# Altium schematic symbol library relay.SCHLIB: 425 symbols (part 3 of 3)
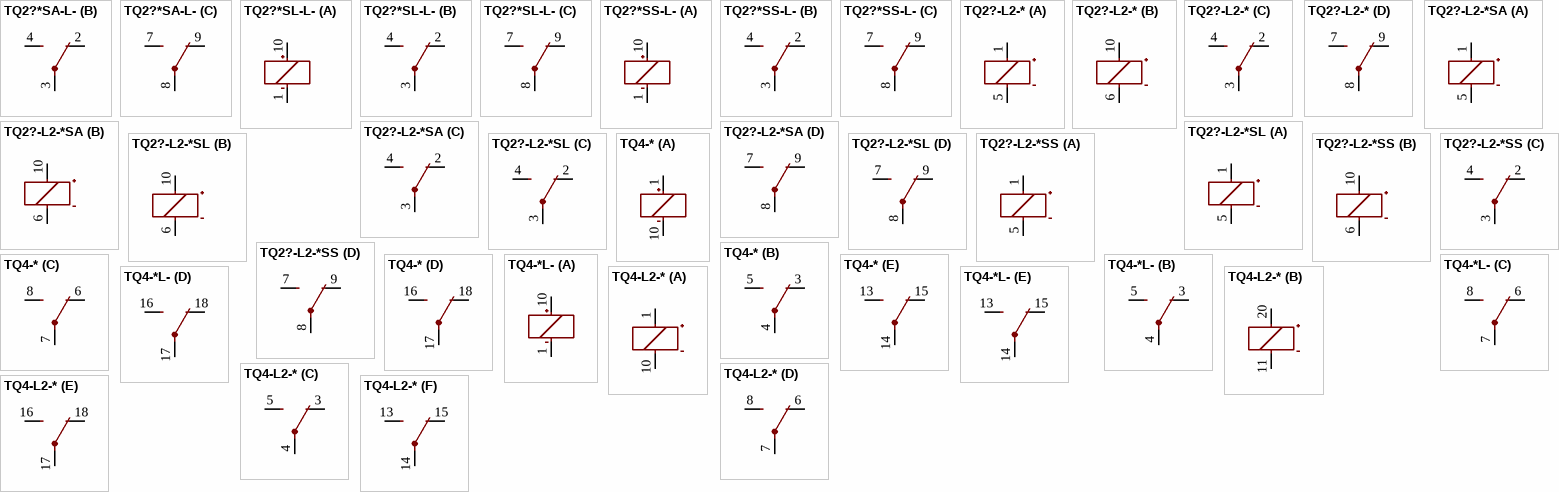
[diagram p32: symbols TQ2?*SA-L- to TQ4-L2-*]

## TQ2?-L2-*SS
designator K?, comment LOW PROFILE 2 FORM C RELAY NAiS   2 coil latching Source: http://www.mew-europe.com/..  en_ds_61020_0001.pdf Source: http://www.mew-europe.com/..  en_ds_61020_0002.pdf  (value not drawn)
MPN: TQ2SS-L2-12V; MPN: TQ2SS-L2-24V; MPN: TQ2SS-L2-3V; MPN: TQ2SS-L2-4.5V-Z; MPN: TQ2SS-L2-5V; MF: AROMAT/ MATSUSHITA; OC_FARNELL: unknown; OC_NEWARK: unknown; OC_NEWARK: 15P9800; OC_NEWARK: 15P9801; OC_NEWARK: 15P9802; OC_NEWARK: 15P9803; OC_NEWARK: 64K3206
footprint TQ-SS
part A pins: 1 +, 5 -
part B pins: 6 -, 10 +
part C pins: 2 O, 3 P, 4 S
part D pins: 7 S, 8 P, 9 O

## TQ4-*
designator K?, comment LOW PROFILE 2 FORM C RELAY NAiS   Source: http://www.mew-europe.com/..  en_ds_61020_0001.pdf  (value not drawn)
MPN: TQ4-24V; MPN: TQ4-3V; MPN: TQ4-4.5V; MPN: TQ4-5V; MF: AROMAT/ MATSUSHITA; OC_FARNELL: unknown; OC_NEWARK: unknown; OC_FARNELL: 1608334; OC_NEWARK: 64K3210; OC_NEWARK: 13P9240; OC_NEWARK: 13P9241; OC_FARNELL: 1448362; OC_NEWARK: 67K1293
footprint TQ4
part A pins: 1 +, 10 -
part B pins: 3 O, 4 P, 5 S
part C pins: 6 O, 7 P, 8 S
part D pins: 16 S, 17 P, 18 O
part E pins: 13 S, 14 P, 15 O

## TQ4-*L-
designator K?, comment LOW PROFILE 2 FORM C RELAY NAiS   Source: http://www.mew-europe.com/..  en_ds_61020_0001.pdf  (value not drawn)
OC_FARNELL: unknown; OC_NEWARK: unknown; OC_FARNELL: 1448362
footprint TQ4
part A pins: 1 -, 10 +
part B pins: 3 O, 4 P, 5 S
part C pins: 6 O, 7 P, 8 S
part D pins: 16 S, 17 P, 18 O
part E pins: 13 S, 14 P, 15 O

## TQ4-L2-*
designator K?, comment LOW PROFILE 2 FORM C RELAY NAiS   2 coil latching Source: http://www.mew-europe.com/..  en_ds_61020_0001.pdf  (value not drawn)
MPN: TQ4-L2-12V; MPN: TQ4-L2-24V; MPN: TQ4-L2-5V; MF: AROMAT/ MATSUSHITA; OC_FARNELL: unknown; OC_NEWARK: 90F5822; OC_NEWARK: 15P9807; OC_NEWARK: unknown; OC_NEWARK: 64K3208
footprint TQ4
part A pins: 1 +, 10 -
part B pins: 11 -, 20 +
part C pins: 3 O, 4 P, 5 S
part D pins: 6 O, 7 P, 8 S
part E pins: 16 S, 17 P, 18 O
part F pins: 13 S, 14 P, 15 O

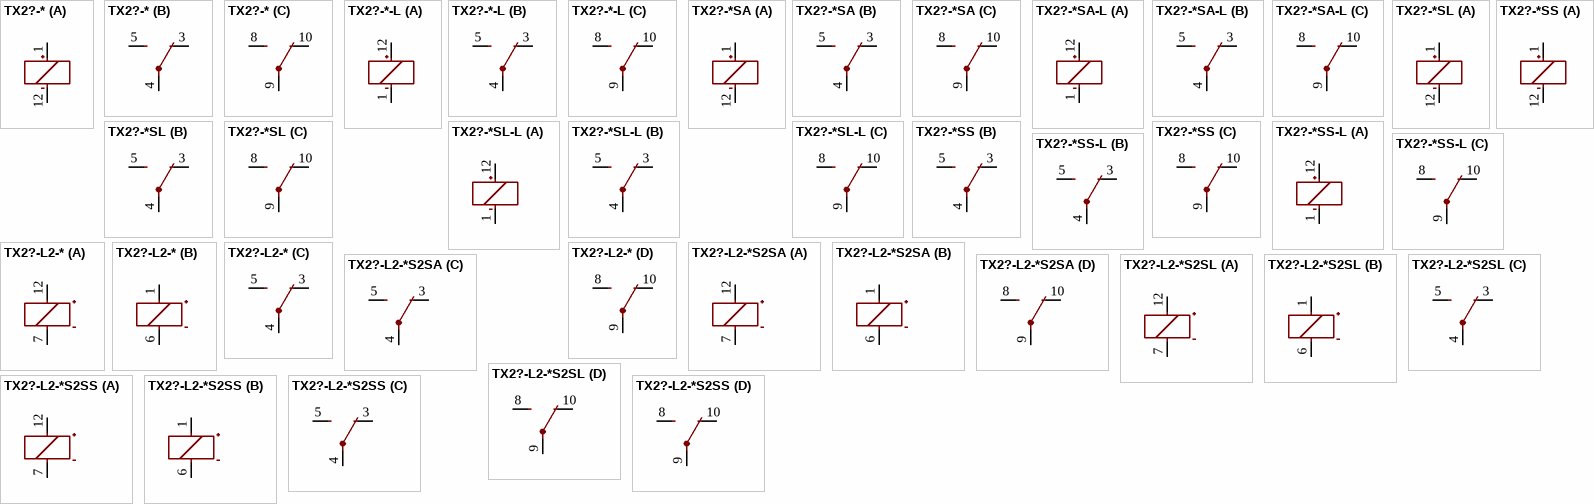
[diagram p26: symbols TX2?-* to TX2?-L2-*S2SS]

## TX2?-*
designator K?, comment 2 AMP. HIGH CAPACITY RELAY NAiS   WITH HIGH SURGE VOLTAGE & HIGH BREAKDOWN VOLTAGE Source: http://www.mew-europe.com/..  en_ds_61022_0001.pdf  (value not drawn)
MPN: TX2-1.5V; MPN: TX2-12V; MPN: TX2-24V; MPN: TX2-3V; MPN: TX2-4.5V; MPN: TX2-5V; MPN: TX2-6V; MPN: TX2-9V; MF: AROMAT/ MATSUSHITA; OC_FARNELL: unknown; OC_NEWARK: 13P9570; OC_FARNELL: 1200952; OC_NEWARK: 67K1295; OC_FARNELL: 1124059; OC_NEWARK: 64K3215; OC_NEWARK: 13P9573; OC_FARNELL: 1200950; OC_NEWARK: 64K3216; OC_NEWARK: 67K1296; OC_NEWARK: 11C0387; OC_NEWARK: 11C0388
footprint TX2
part A pins: 1 +, 12 -
part B pins: 3 O, 4 P, 5 S
part C pins: 8 S, 9 P, 10 O

## TX2?-*-L
designator K?, comment 2 AMP. HIGH CAPACITY RELAY NAiS   WITH HIGH SURGE VOLTAGE & HIGH BREAKDOWN VOLTAGE Source: http://www.mew-europe.com/..  en_ds_61022_0001.pdf  (value not drawn)
MPN: TX2-L-12V; MPN: TX2-L-24V-1; MPN: TX2-L-3V; MPN: TX2-L-4.5V; MPN: TX2-L-5V; MPN: TX2-L-9V; OC_FARNELL: unknown; OC_NEWARK: unknown; OC_NEWARK: 11C0367; OC_NEWARK: 12N3976; OC_NEWARK: 15P9975; OC_NEWARK: 15P9976; OC_NEWARK: 15P9977; OC_NEWARK: 15P9978
footprint TX2
part A pins: 1 -, 12 +
part B pins: 3 O, 4 P, 5 S
part C pins: 8 S, 9 P, 10 O

## TX2?-*SA
designator K?, comment 2 AMP. HIGH CAPACITY RELAY NAiS   WITH HIGH SURGE VOLTAGE & HIGH BREAKDOWN VOLTAGE Source: http://www.mew-europe.com/..  en_ds_61022_0001.pdf  (value not drawn)
MPN: TX2SA-12V; MPN: TX2SA-24V; MPN: TX2SA-3V; MPN: TX2SA-4.5V; MPN: TX2SA-5V; MPN: TX2SA-6V-X; MPN: TX2SA-9V; MF: AROMAT/ MATSUSHITA; OC_FARNELL: unknown; OC_NEWARK: unknown; OC_FARNELL: 910480; OC_NEWARK: 64K3217; OC_FARNELL: 1652603; OC_NEWARK: 64K3218; OC_NEWARK: 13P9584; OC_NEWARK: 92F1604; OC_FARNELL: 1200957; OC_NEWARK: 13P9589; OC_NEWARK: 13P9592; OC_NEWARK: 13P9593
footprint TX2SA
part A pins: 1 +, 12 -
part B pins: 3 O, 4 P, 5 S
part C pins: 8 S, 9 P, 10 O

## TX2?-*SA-L
designator K?, comment 2 AMP. HIGH CAPACITY RELAY NAiS   WITH HIGH SURGE VOLTAGE & HIGH BREAKDOWN VOLTAGE Source: http://www.mew-europe.com/..  en_ds_61022_0001.pdf  (value not drawn)
OC_FARNELL: unknown; OC_NEWARK: unknown
footprint TX2SA
part A pins: 1 -, 12 +
part B pins: 3 O, 4 P, 5 S
part C pins: 8 S, 9 P, 10 O

## TX2?-*SL
designator K?, comment 2 AMP. HIGH CAPACITY RELAY NAiS   WITH HIGH SURGE VOLTAGE & HIGH BREAKDOWN VOLTAGE Source: http://www.mew-europe.com/..  en_ds_61022_0001.pdf  (value not drawn)
MPN: TX2SL-12V; MPN: TX2SL-24V; MPN: TX2SL-3V; MPN: TX2SL-4.5V; MPN: TX2SL-48V; MPN: TX2SL-5V; MPN: TX2SL-9V-1; MF: AROMAT/ MATSUSHITA; OC_FARNELL: unknown; OC_NEWARK: unknown; OC_NEWARK: 11C0519; OC_NEWARK: 16P9442; OC_NEWARK: 13P9598; OC_NEWARK: 13P9600; OC_NEWARK: 13P9602; OC_NEWARK: 13P9603; OC_NEWARK: 11N6123
footprint TX2SL
part A pins: 1 +, 12 -
part B pins: 3 O, 4 P, 5 S
part C pins: 8 S, 9 P, 10 O

## TX2?-*SL-L
designator K?, comment 2 AMP. HIGH CAPACITY RELAY NAiS   WITH HIGH SURGE VOLTAGE & HIGH BREAKDOWN VOLTAGE Source: http://www.mew-europe.com/..  en_ds_61022_0001.pdf  (value not drawn)
MPN: TX2SL-L-24V-1; MPN: TX2SL-L-3V; MF: AROMAT/ MATSUSHITA; OC_FARNELL: unknown; OC_NEWARK: unknown; OC_NEWARK: 12N3990; OC_NEWARK: 11C0477
footprint TX2SL
part A pins: 1 -, 12 +
part B pins: 3 O, 4 P, 5 S
part C pins: 8 S, 9 P, 10 O

## TX2?-*SS
designator K?, comment 2 AMP. HIGH CAPACITY RELAY NAiS   WITH HIGH SURGE VOLTAGE & HIGH BREAKDOWN VOLTAGE Source: http://www.mew-europe.com/..  en_ds_61022_0001.pdf  (value not drawn)
MPN: TX2SS-24V; MPN: TX2SS-3V-Z; MPN: TX2SS-4.5V; MPN: TX2SS-48V; MPN: TX2SS-5V; OC_FARNELL: unknown; OC_NEWARK: unknown; OC_NEWARK: 13P9605; OC_NEWARK: 13P9606; OC_NEWARK: 13P9607; OC_NEWARK: 13P9609; OC_NEWARK: 13P9610
footprint TX2SS
part A pins: 1 +, 12 -
part B pins: 3 O, 4 P, 5 S
part C pins: 8 S, 9 P, 10 O

## TX2?-*SS-L
designator K?, comment 2 AMP. HIGH CAPACITY RELAY NAiS   WITH HIGH SURGE VOLTAGE & HIGH BREAKDOWN VOLTAGE Source: http://www.mew-europe.com/..  en_ds_61022_0001.pdf  (value not drawn)
MPN: TX2SS-L-12V-Z; MPN: TX2SS-L-3V-1; MF: AROMAT/ MATSUSHITA; OC_FARNELL: unknown; OC_NEWARK: unknown; OC_NEWARK: 11C0549; OC_NEWARK: 12N3991
footprint TX2SS
part A pins: 1 -, 12 +
part B pins: 3 O, 4 P, 5 S
part C pins: 8 S, 9 P, 10 O

## TX2?-L2-*
designator K?, comment TX Relay 2 coil latching NAiS   2 AMP. HIGH CAPACITY RELAY WITH HIGH SURGE VOLTAGE & HIGH BREAKDOWN VOLTAGE Source: http://www.mew-europe.com/..  en_ds_61022_0001.pdf TX-S SMALL POLARIZED WITH HIGH SENSITIVITY 50mW Source: http://www.mew-europe.com/..  en_ds_61022_0022.pdf  (value not drawn)
MPN: TX2-L2-12V; MPN: TX2-L2-24V; MPN: TX2-L2-3V-1; MPN: TX2-L2-4.5V; MPN: TX2-L2-5V; MPN: TX2-L2-9V; MF: AROMAT/ MATSUSHITA; OC_FARNELL: unknown; OC_NEWARK: unknown; OC_FARNELL: 1124060; OC_NEWARK: 64K3213; OC_FARNELL: 1124061; OC_NEWARK: 31M0467; OC_NEWARK: 12N3980; OC_NEWARK: 15P9981; OC_FARNELL: 625826; OC_NEWARK: 15P9982; OC_NEWARK: 15P9984
footprint TX2-L2
part A pins: 7 -, 12 +
part B pins: 1 +, 6 -
part C pins: 3 O, 4 P, 5 S
part D pins: 8 S, 9 P, 10 O

## TX2?-L2-*S2SA
designator K?, comment TX Relay 2 coil latching NAiS   2 AMP. HIGH CAPACITY RELAY WITH HIGH SURGE VOLTAGE & HIGH BREAKDOWN VOLTAGE Source: http://www.mew-europe.com/..  en_ds_61022_0001.pdf TX-S SMALL POLARIZED WITH HIGH SENSITIVITY 50mW Source: http://www.mew-europe.com/..  en_ds_61022_0022.pdf  (value not drawn)
OC_FARNELL: unknown; OC_NEWARK: unknown
footprint TX2SA-L2
part A pins: 7 -, 12 +
part B pins: 1 +, 6 -
part C pins: 3 O, 4 P, 5 S
part D pins: 8 S, 9 P, 10 O

## TX2?-L2-*S2SL
designator K?, comment TX Relay 2 coil latching NAiS   2 AMP. HIGH CAPACITY RELAY WITH HIGH SURGE VOLTAGE & HIGH BREAKDOWN VOLTAGE Source: http://www.mew-europe.com/..  en_ds_61022_0001.pdf TX-S SMALL POLARIZED WITH HIGH SENSITIVITY 50mW Source: http://www.mew-europe.com/..  en_ds_61022_0022.pdf  (value not drawn)
OC_FARNELL: unknown; OC_NEWARK: unknown
footprint TX2SL-L2
part A pins: 7 -, 12 +
part B pins: 1 +, 6 -
part C pins: 3 O, 4 P, 5 S
part D pins: 8 S, 9 P, 10 O

## TX2?-L2-*S2SS
designator K?, comment TX Relay 2 coil latching NAiS   2 AMP. HIGH CAPACITY RELAY WITH HIGH SURGE VOLTAGE & HIGH BREAKDOWN VOLTAGE Source: http://www.mew-europe.com/..  en_ds_61022_0001.pdf TX-S SMALL POLARIZED WITH HIGH SENSITIVITY 50mW Source: http://www.mew-europe.com/..  en_ds_61022_0022.pdf  (value not drawn)
OC_FARNELL: unknown; OC_NEWARK: unknown
footprint TX2SS-L2
part A pins: 7 -, 12 +
part B pins: 1 +, 6 -
part C pins: 3 O, 4 P, 5 S
part D pins: 8 S, 9 P, 10 O

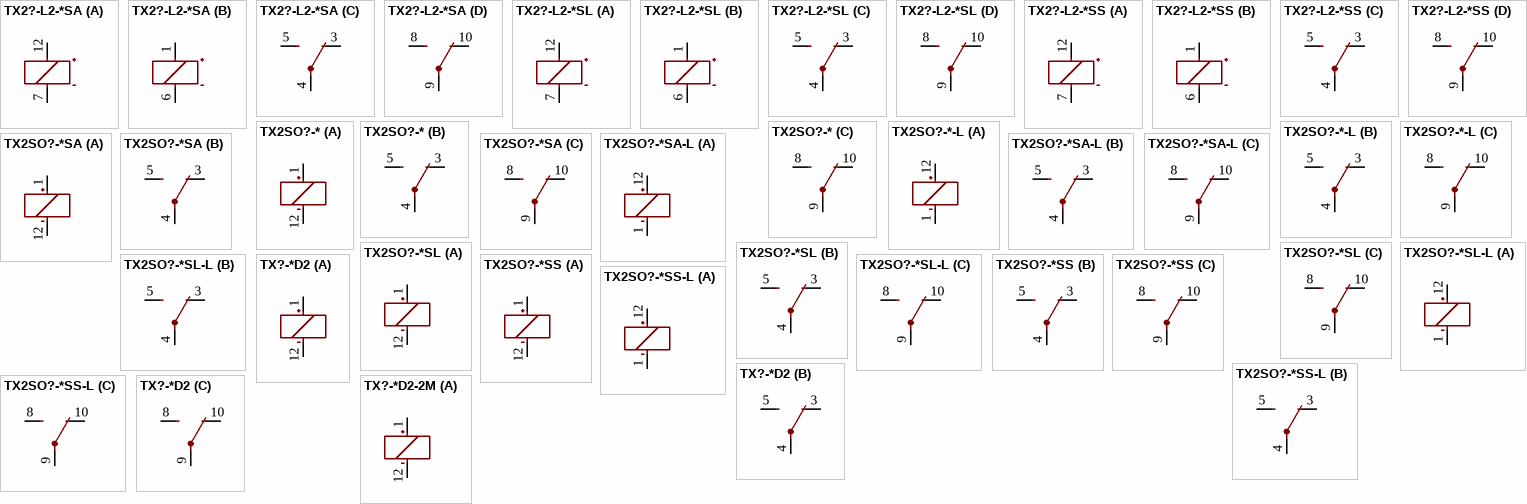
[diagram p27: symbols TX2?-L2-*SA to TX?-*D2-2M]

## TX2?-L2-*SA
designator K?, comment TX Relay 2 coil latching NAiS   2 AMP. HIGH CAPACITY RELAY WITH HIGH SURGE VOLTAGE & HIGH BREAKDOWN VOLTAGE Source: http://www.mew-europe.com/..  en_ds_61022_0001.pdf TX-S SMALL POLARIZED WITH HIGH SENSITIVITY 50mW Source: http://www.mew-europe.com/..  en_ds_61022_0022.pdf  (value not drawn)
MPN: TX2SA-L2-12V; MPN: TX2SA-L2-24V-1; MPN: TX2SA-L2-3V; MPN: TX2SA-L2-4.5V; MPN: TX2SA-L2-5V; MPN: TX2SA-L2-6V-X; MF: AROMAT/ MATSUSHITA; OC_FARNELL: unknown; OC_NEWARK: unknown; OC_NEWARK: 92F1610; OC_NEWARK: 12N3986; OC_NEWARK: 15P9991; OC_NEWARK: 15P9993; OC_NEWARK: 15P9995; OC_NEWARK: 13P9578
footprint TX2SA-L2
part A pins: 7 -, 12 +
part B pins: 1 +, 6 -
part C pins: 3 O, 4 P, 5 S
part D pins: 8 S, 9 P, 10 O

## TX2?-L2-*SL
designator K?, comment TX Relay 2 coil latching NAiS   2 AMP. HIGH CAPACITY RELAY WITH HIGH SURGE VOLTAGE & HIGH BREAKDOWN VOLTAGE Source: http://www.mew-europe.com/..  en_ds_61022_0001.pdf TX-S SMALL POLARIZED WITH HIGH SENSITIVITY 50mW Source: http://www.mew-europe.com/..  en_ds_61022_0022.pdf  (value not drawn)
MPN: TX2SL-L2-4.5V; MPN: TX2SL-L2-5V; MPN: TX2SL-L2-9V-Z; OC_FARNELL: unknown; OC_NEWARK: unknown; OC_NEWARK: 15P9998; OC_NEWARK: 16P0001; OC_NEWARK: 16P0002
footprint TX2SL-L2
part A pins: 7 -, 12 +
part B pins: 1 +, 6 -
part C pins: 3 O, 4 P, 5 S
part D pins: 8 S, 9 P, 10 O

## TX2?-L2-*SS
designator K?, comment TX Relay 2 coil latching NAiS   2 AMP. HIGH CAPACITY RELAY WITH HIGH SURGE VOLTAGE & HIGH BREAKDOWN VOLTAGE Source: http://www.mew-europe.com/..  en_ds_61022_0001.pdf TX-S SMALL POLARIZED WITH HIGH SENSITIVITY 50mW Source: http://www.mew-europe.com/..  en_ds_61022_0022.pdf  (value not drawn)
MPN: TX2SS-L2-9V; OC_FARNELL: unknown; OC_NEWARK: unknown; OC_NEWARK: 16P0003
footprint TX2SS-L2
part A pins: 7 -, 12 +
part B pins: 1 +, 6 -
part C pins: 3 O, 4 P, 5 S
part D pins: 8 S, 9 P, 10 O

## TX2SO?-*
designator K?, comment 2 AMP. HIGH CAPACITY RELAY NAiS   WITH HIGH SURGE VOLTAGE & HIGH BREAKDOWN VOLTAGE Source: http://www.mew-europe.com/..  en_ds_61022_0001.pdf  (value not drawn)
OC_FARNELL: unknown; OC_NEWARK: unknown
footprint TX2
part A pins: 1 +, 12 -
part B pins: 3 O, 4 P, 5 S
part C pins: 8 S, 9 P, 10 O

## TX2SO?-*-L
designator K?, comment 2 AMP. HIGH CAPACITY RELAY NAiS   WITH HIGH SURGE VOLTAGE & HIGH BREAKDOWN VOLTAGE Source: http://www.mew-europe.com/..  en_ds_61022_0001.pdf  (value not drawn)
OC_FARNELL: unknown; OC_NEWARK: unknown
footprint TX2
part A pins: 1 -, 12 +
part B pins: 3 O, 4 P, 5 S
part C pins: 8 S, 9 P, 10 O

## TX2SO?-*SA
designator K?, comment 2 AMP. HIGH CAPACITY RELAY NAiS   WITH HIGH SURGE VOLTAGE & HIGH BREAKDOWN VOLTAGE Source: http://www.mew-europe.com/..  en_ds_61022_0001.pdf  (value not drawn)
OC_FARNELL: unknown; OC_NEWARK: unknown
footprint TX2SA
part A pins: 1 +, 12 -
part B pins: 3 O, 4 P, 5 S
part C pins: 8 S, 9 P, 10 O

## TX2SO?-*SA-L
designator K?, comment 2 AMP. HIGH CAPACITY RELAY NAiS   WITH HIGH SURGE VOLTAGE & HIGH BREAKDOWN VOLTAGE Source: http://www.mew-europe.com/..  en_ds_61022_0001.pdf  (value not drawn)
OC_FARNELL: unknown; OC_NEWARK: unknown
footprint TX2SA
part A pins: 1 -, 12 +
part B pins: 3 O, 4 P, 5 S
part C pins: 8 S, 9 P, 10 O

## TX2SO?-*SL
designator K?, comment 2 AMP. HIGH CAPACITY RELAY NAiS   WITH HIGH SURGE VOLTAGE & HIGH BREAKDOWN VOLTAGE Source: http://www.mew-europe.com/..  en_ds_61022_0001.pdf  (value not drawn)
OC_FARNELL: unknown; OC_NEWARK: unknown
footprint TX2SL
part A pins: 1 +, 12 -
part B pins: 3 O, 4 P, 5 S
part C pins: 8 S, 9 P, 10 O

## TX2SO?-*SL-L
designator K?, comment 2 AMP. HIGH CAPACITY RELAY NAiS   WITH HIGH SURGE VOLTAGE & HIGH BREAKDOWN VOLTAGE Source: http://www.mew-europe.com/..  en_ds_61022_0001.pdf  (value not drawn)
OC_FARNELL: unknown; OC_NEWARK: unknown
footprint TX2SL
part A pins: 1 -, 12 +
part B pins: 3 O, 4 P, 5 S
part C pins: 8 S, 9 P, 10 O

## TX2SO?-*SS
designator K?, comment 2 AMP. HIGH CAPACITY RELAY NAiS   WITH HIGH SURGE VOLTAGE & HIGH BREAKDOWN VOLTAGE Source: http://www.mew-europe.com/..  en_ds_61022_0001.pdf  (value not drawn)
OC_FARNELL: unknown; OC_NEWARK: unknown
footprint TX2SS
part A pins: 1 +, 12 -
part B pins: 3 O, 4 P, 5 S
part C pins: 8 S, 9 P, 10 O

## TX2SO?-*SS-L
designator K?, comment 2 AMP. HIGH CAPACITY RELAY NAiS   WITH HIGH SURGE VOLTAGE & HIGH BREAKDOWN VOLTAGE Source: http://www.mew-europe.com/..  en_ds_61022_0001.pdf  (value not drawn)
OC_FARNELL: unknown; OC_NEWARK: unknown
footprint TX2SS
part A pins: 1 -, 12 +
part B pins: 3 O, 4 P, 5 S
part C pins: 8 S, 9 P, 10 O

## TX?-*D2
designator K?, comment TX Relais NAiS   TX-D RELAYS HIGH INSULATION Conforming to the supplementary insulation class of EN Standards (EN41003) Source: http://www.mew-europe.com/..  en_ds_61022_0007.pdf TX-S RELAYS SMALL POLARIZED RELAY WITH HIGH SENSITIVITY 50mW Source: http://www.mew-europe.com/..  en_ds_61022_0022.pdf  (value not drawn)
MPN: TXD2-12V; MPN: TXD2-24V; MPN: TXD2-3V; MPN: TXD2-5V; OC_FARNELL: unknown; OC_NEWARK: unknown; OC_NEWARK: 13P9522; OC_NEWARK: 13P9523; OC_NEWARK: 13P9524; OC_NEWARK: 13P9525
footprint TXD2
part A pins: 1 +, 12 -
part B pins: 3 O, 4 P, 5 S
part C pins: 8 S, 9 P, 10 O

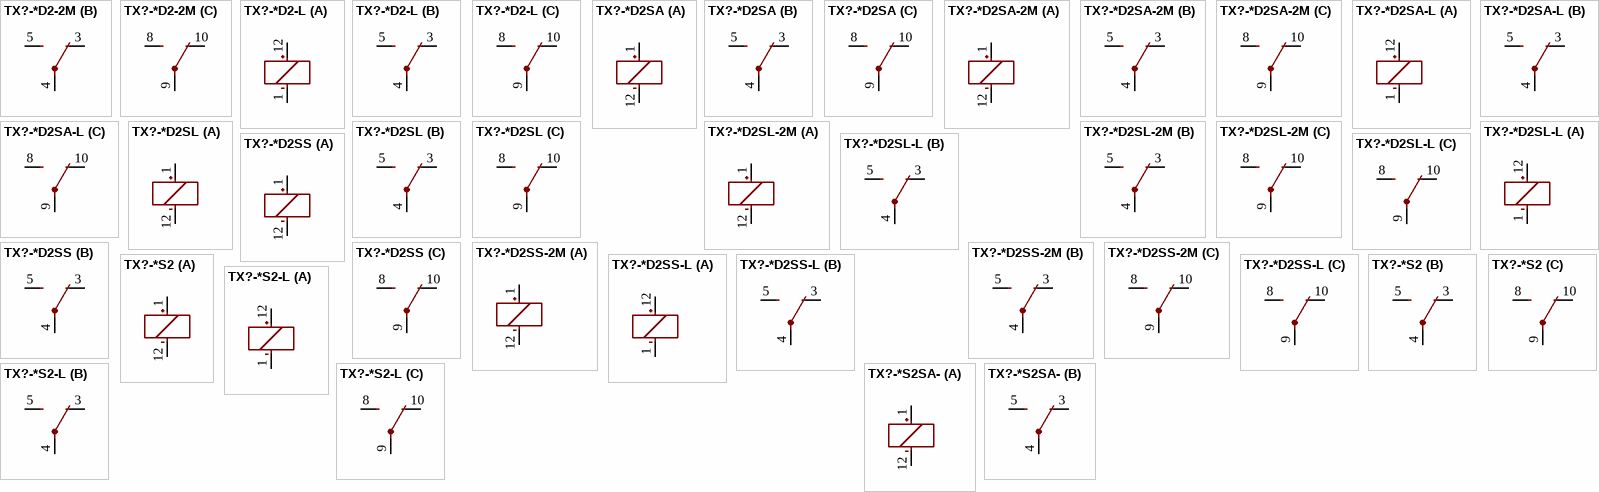
[diagram p28: symbols TX?-*D2-2M to TX?-*S2SA-]

## TX?-*D2-2M
designator K?, comment TX Relais NAiS   TX-D RELAYS HIGH INSULATION Conforming to the supplementary insulation class of EN Standards (EN41003) Source: http://www.mew-europe.com/..  en_ds_61022_0007.pdf TX-S RELAYS SMALL POLARIZED RELAY WITH HIGH SENSITIVITY 50mW Source: http://www.mew-europe.com/..  en_ds_61022_0022.pdf  (value not drawn)
OC_FARNELL: unknown; OC_NEWARK: unknown
footprint TXD2
part A pins: 1 +, 12 -
part B pins: 3 O, 4 P, 5 S
part C pins: 8 S, 9 P, 10 O

## TX?-*D2-L
designator K?, comment TX Relais NAiS   TX-D RELAYS HIGH INSULATION Conforming to the supplementary insulation class of EN Standards (EN41003) Source: http://www.mew-europe.com/..  en_ds_61022_0007.pdf TX-S RELAYS SMALL POLARIZED RELAY WITH HIGH SENSITIVITY 50mW Source: http://www.mew-europe.com/..  en_ds_61022_0022.pdf  (value not drawn)
MPN: TXD2-L-4.5V; MF: AROMAT/ MATSUSHITA; OC_FARNELL: unknown; OC_NEWARK: unknown; OC_NEWARK: 11C0103
footprint TXD2
part A pins: 1 -, 12 +
part B pins: 3 O, 4 P, 5 S
part C pins: 8 S, 9 P, 10 O

## TX?-*D2SA
designator K?, comment TX Relais NAiS   TX-D RELAYS HIGH INSULATION Conforming to the supplementary insulation class of EN Standards (EN41003) Source: http://www.mew-europe.com/..  en_ds_61022_0007.pdf TX-S RELAYS SMALL POLARIZED RELAY WITH HIGH SENSITIVITY 50mW Source: http://www.mew-europe.com/..  en_ds_61022_0022.pdf  (value not drawn)
MPN: TXD2SA-12V; MPN: TXD2SA-3V; MPN: TXD2SA-4.5V; MPN: TXD2SA-5V; MPN: TXD2SA-6V; MF: AROMAT/ MATSUSHITA; OC_FARNELL: unknown; OC_NEWARK: unknown; OC_NEWARK: 13P9526; OC_NEWARK: 11C0176; OC_NEWARK: 13P9531; OC_NEWARK: 13P9532; OC_NEWARK: 13P9534
footprint TXD2SA
part A pins: 1 +, 12 -
part B pins: 3 O, 4 P, 5 S
part C pins: 8 S, 9 P, 10 O

## TX?-*D2SA-2M
designator K?, comment TX Relais NAiS   TX-D RELAYS HIGH INSULATION Conforming to the supplementary insulation class of EN Standards (EN41003) Source: http://www.mew-europe.com/..  en_ds_61022_0007.pdf TX-S RELAYS SMALL POLARIZED RELAY WITH HIGH SENSITIVITY 50mW Source: http://www.mew-europe.com/..  en_ds_61022_0022.pdf  (value not drawn)
OC_FARNELL: unknown; OC_NEWARK: unknown
footprint TXD2SA
part A pins: 1 +, 12 -
part B pins: 3 O, 4 P, 5 S
part C pins: 8 S, 9 P, 10 O

## TX?-*D2SA-L
designator K?, comment TX Relais NAiS   TX-D RELAYS HIGH INSULATION Conforming to the supplementary insulation class of EN Standards (EN41003) Source: http://www.mew-europe.com/..  en_ds_61022_0007.pdf TX-S RELAYS SMALL POLARIZED RELAY WITH HIGH SENSITIVITY 50mW Source: http://www.mew-europe.com/..  en_ds_61022_0022.pdf  (value not drawn)
OC_FARNELL: unknown; OC_NEWARK: unknown
footprint TXD2SA
part A pins: 1 -, 12 +
part B pins: 3 O, 4 P, 5 S
part C pins: 8 S, 9 P, 10 O

## TX?-*D2SL
designator K?, comment TX Relais NAiS   TX-D RELAYS HIGH INSULATION Conforming to the supplementary insulation class of EN Standards (EN41003) Source: http://www.mew-europe.com/..  en_ds_61022_0007.pdf TX-S RELAYS SMALL POLARIZED RELAY WITH HIGH SENSITIVITY 50mW Source: http://www.mew-europe.com/..  en_ds_61022_0022.pdf  (value not drawn)
MPN: TXD2SL-3V; MPN: TXD2SL-4.5V-X; MF: AROMAT/ MATSUSHITA; OC_FARNELL: unknown; OC_NEWARK: unknown; OC_NEWARK: 11C0248; OC_NEWARK: 11N6056
footprint TXD2SL
part A pins: 1 +, 12 -
part B pins: 3 O, 4 P, 5 S
part C pins: 8 S, 9 P, 10 O

## TX?-*D2SL-2M
designator K?, comment TX Relais NAiS   TX-D RELAYS HIGH INSULATION Conforming to the supplementary insulation class of EN Standards (EN41003) Source: http://www.mew-europe.com/..  en_ds_61022_0007.pdf TX-S RELAYS SMALL POLARIZED RELAY WITH HIGH SENSITIVITY 50mW Source: http://www.mew-europe.com/..  en_ds_61022_0022.pdf  (value not drawn)
OC_FARNELL: unknown; OC_NEWARK: unknown
footprint TXD2SL
part A pins: 1 +, 12 -
part B pins: 3 O, 4 P, 5 S
part C pins: 8 S, 9 P, 10 O

## TX?-*D2SL-L
designator K?, comment TX Relais NAiS   TX-D RELAYS HIGH INSULATION Conforming to the supplementary insulation class of EN Standards (EN41003) Source: http://www.mew-europe.com/..  en_ds_61022_0007.pdf TX-S RELAYS SMALL POLARIZED RELAY WITH HIGH SENSITIVITY 50mW Source: http://www.mew-europe.com/..  en_ds_61022_0022.pdf  (value not drawn)
MPN: TXD2SL-L-12V; MPN: TXD2SL-L-24V; MPN: TXD2SL-L-5V; OC_FARNELL: unknown; OC_NEWARK: unknown; OC_NEWARK: 15P9956; OC_NEWARK: 15P9958; OC_NEWARK: 15P9960
footprint TXD2SL
part A pins: 1 -, 12 +
part B pins: 3 O, 4 P, 5 S
part C pins: 8 S, 9 P, 10 O

## TX?-*D2SS
designator K?, comment TX Relais NAiS   TX-D RELAYS HIGH INSULATION Conforming to the supplementary insulation class of EN Standards (EN41003) Source: http://www.mew-europe.com/..  en_ds_61022_0007.pdf TX-S RELAYS SMALL POLARIZED RELAY WITH HIGH SENSITIVITY 50mW Source: http://www.mew-europe.com/..  en_ds_61022_0022.pdf  (value not drawn)
MPN: TXD2SS-12V-Z; MPN: TXD2SS-24V-Z; MPN: TXD2SS-3V; MPN: TXD2SS-5V; MF: AROMAT/ MATSUSHITA; OC_FARNELL: unknown; OC_NEWARK: unknown; OC_NEWARK: 13P9535; OC_NEWARK: 13P9536; OC_NEWARK: 11C0320; OC_NEWARK: 11C0326
footprint TXD2SS
part A pins: 1 +, 12 -
part B pins: 3 O, 4 P, 5 S
part C pins: 8 S, 9 P, 10 O

## TX?-*D2SS-2M
designator K?, comment TX Relais NAiS   TX-D RELAYS HIGH INSULATION Conforming to the supplementary insulation class of EN Standards (EN41003) Source: http://www.mew-europe.com/..  en_ds_61022_0007.pdf TX-S RELAYS SMALL POLARIZED RELAY WITH HIGH SENSITIVITY 50mW Source: http://www.mew-europe.com/..  en_ds_61022_0022.pdf  (value not drawn)
MPN: TXD2SS-2M-12V; MF: AROMAT/ MATSUSHITA; OC_FARNELL: unknown; OC_NEWARK: unknown; OC_NEWARK: 11C0296
footprint TXD2SS
part A pins: 1 +, 12 -
part B pins: 3 O, 4 P, 5 S
part C pins: 8 S, 9 P, 10 O

## TX?-*D2SS-L
designator K?, comment TX Relais NAiS   TX-D RELAYS HIGH INSULATION Conforming to the supplementary insulation class of EN Standards (EN41003) Source: http://www.mew-europe.com/..  en_ds_61022_0007.pdf TX-S RELAYS SMALL POLARIZED RELAY WITH HIGH SENSITIVITY 50mW Source: http://www.mew-europe.com/..  en_ds_61022_0022.pdf  (value not drawn)
OC_FARNELL: unknown; OC_NEWARK: unknown
footprint TXD2SS
part A pins: 1 -, 12 +
part B pins: 3 O, 4 P, 5 S
part C pins: 8 S, 9 P, 10 O

## TX?-*S2
designator K?, comment TX Relais NAiS   TX-D RELAYS HIGH INSULATION Conforming to the supplementary insulation class of EN Standards (EN41003) Source: http://www.mew-europe.com/..  en_ds_61022_0007.pdf TX-S RELAYS SMALL POLARIZED RELAY WITH HIGH SENSITIVITY 50mW Source: http://www.mew-europe.com/..  en_ds_61022_0022.pdf  (value not drawn)
MPN: TXS2-12V; MPN: TXS2-24V; MPN: TXS2-3V; MPN: TXS2-4.5V; MPN: TXS2-6V; MPN: TXS2-9V; OC_FARNELL: unknown; OC_NEWARK: unknown; OC_NEWARK: 13P9539; OC_NEWARK: 13P9540; OC_NEWARK: 13P9541; OC_FARNELL: 1608335; OC_NEWARK: 13P9542; OC_NEWARK: 13P9543; OC_NEWARK: 11N6058
footprint TXD2
part A pins: 1 +, 12 -
part B pins: 3 O, 4 P, 5 S
part C pins: 8 S, 9 P, 10 O

## TX?-*S2-L
designator K?, comment TX Relais NAiS   TX-D RELAYS HIGH INSULATION Conforming to the supplementary insulation class of EN Standards (EN41003) Source: http://www.mew-europe.com/..  en_ds_61022_0007.pdf TX-S RELAYS SMALL POLARIZED RELAY WITH HIGH SENSITIVITY 50mW Source: http://www.mew-europe.com/..  en_ds_61022_0022.pdf  (value not drawn)
MPN: TXS2-L-1.5V; MPN: TXS2-L-12V; MPN: TXS2-L-24V; MPN: TXS2-L-3V; MPN: TXS2-L-4.5V; MPN: TXS2-L-9V; OC_FARNELL: unknown; OC_NEWARK: 12N3844; OC_NEWARK: 12N3845; OC_NEWARK: 12N3846; OC_NEWARK: 15P9962; OC_NEWARK: 15P9963; OC_NEWARK: unknown; OC_NEWARK: 12N3848
footprint TXD2
part A pins: 1 -, 12 +
part B pins: 3 O, 4 P, 5 S
part C pins: 8 S, 9 P, 10 O

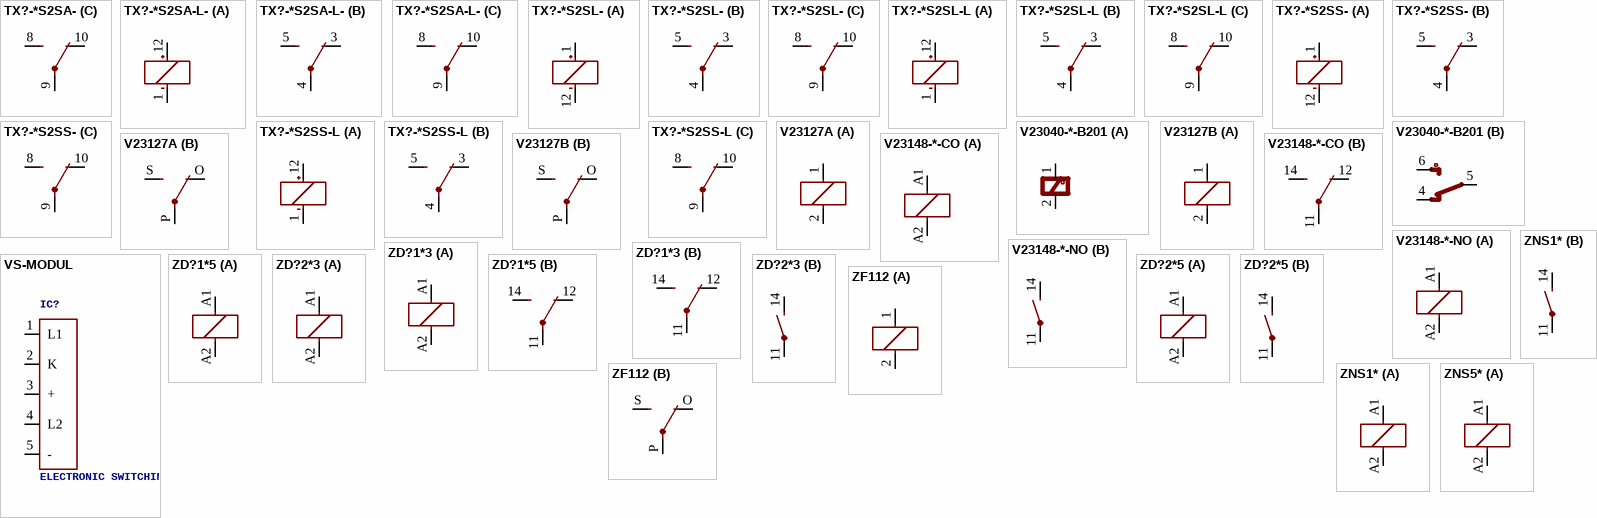
[diagram p29: symbols TX?-*S2SA- to ZNS5*]

## TX?-*S2SA-
designator K?, comment TX Relais NAiS   TX-D RELAYS HIGH INSULATION Conforming to the supplementary insulation class of EN Standards (EN41003) Source: http://www.mew-europe.com/..  en_ds_61022_0007.pdf TX-S RELAYS SMALL POLARIZED RELAY WITH HIGH SENSITIVITY 50mW Source: http://www.mew-europe.com/..  en_ds_61022_0022.pdf  (value not drawn)
MPN: TXS2SA-1.5V; MPN: TXS2SA-12V; MPN: TXS2SA-24V; MPN: TXS2SA-3V; MPN: TXS2SA-4.5V; MPN: TXS2SA-6V; MPN: TXS2SA-9V; MF: AROMAT/ MATSUSHITA; OC_FARNELL: unknown; OC_NEWARK: 11N6059; OC_FARNELL: 1231846; OC_NEWARK: 13P9545; OC_NEWARK: 11C0345; OC_NEWARK: 11N6066; OC_NEWARK: 13P9550; OC_NEWARK: unknown; OC_NEWARK: 13P9552; OC_NEWARK: 97H8371
footprint TXD2SA
part A pins: 1 +, 12 -
part B pins: 3 O, 4 P, 5 S
part C pins: 8 S, 9 P, 10 O

## TX?-*S2SA-L-
designator K?, comment TX Relais NAiS   TX-D RELAYS HIGH INSULATION Conforming to the supplementary insulation class of EN Standards (EN41003) Source: http://www.mew-europe.com/..  en_ds_61022_0007.pdf TX-S RELAYS SMALL POLARIZED RELAY WITH HIGH SENSITIVITY 50mW Source: http://www.mew-europe.com/..  en_ds_61022_0022.pdf  (value not drawn)
MPN: TXS2SA-L-1.5V; MPN: TXS2SA-L-12V; MPN: TXS2SA-L-24V; MPN: TXS2SA-L-3V; MPN: TXS2SA-L-4.5V; MPN: TXS2SA-L-5V; MPN: TXS2SA-L-6V; MPN: TXS2SA-L-9V; OC_FARNELL: unknown; OC_NEWARK: 12N3853; OC_NEWARK: 12N3856; OC_NEWARK: 12N3859; OC_NEWARK: 12N3862; OC_NEWARK: 15P9968; OC_NEWARK: 12N3867; OC_NEWARK: 12N3870; OC_NEWARK: 12N3873
footprint TXD2SA
part A pins: 1 -, 12 +
part B pins: 3 O, 4 P, 5 S
part C pins: 8 S, 9 P, 10 O

## TX?-*S2SL-
designator K?, comment TX Relais NAiS   TX-D RELAYS HIGH INSULATION Conforming to the supplementary insulation class of EN Standards (EN41003) Source: http://www.mew-europe.com/..  en_ds_61022_0007.pdf TX-S RELAYS SMALL POLARIZED RELAY WITH HIGH SENSITIVITY 50mW Source: http://www.mew-europe.com/..  en_ds_61022_0022.pdf  (value not drawn)
MPN: TXS2SL-1.5V; MPN: TXS2SL-12V; MPN: TXS2SL-24V; MPN: TXS2SL-3V-Z; MPN: TXS2SL-4.5V; MPN: TXS2SL-6V; MPN: TXS2SL-9V; OC_FARNELL: unknown; OC_NEWARK: 11N6074; OC_NEWARK: 11N6077; OC_NEWARK: 11N6081; OC_NEWARK: 13P9555; OC_NEWARK: 13P9556; OC_NEWARK: unknown; OC_NEWARK: 11N6087; OC_NEWARK: 11N6090
footprint TXD2SL
part A pins: 1 +, 12 -
part B pins: 3 O, 4 P, 5 S
part C pins: 8 S, 9 P, 10 O

## TX?-*S2SL-L
designator K?, comment TX Relais NAiS   TX-D RELAYS HIGH INSULATION Conforming to the supplementary insulation class of EN Standards (EN41003) Source: http://www.mew-europe.com/..  en_ds_61022_0007.pdf TX-S RELAYS SMALL POLARIZED RELAY WITH HIGH SENSITIVITY 50mW Source: http://www.mew-europe.com/..  en_ds_61022_0022.pdf  (value not drawn)
MPN: TXS2SL-L-1.5V; MPN: TXS2SL-L-12V; MPN: TXS2SL-L-24V; MPN: TXS2SL-L-3V; MPN: TXS2SL-L-4.5V; MPN: TXS2SL-L-6V; MPN: TXS2SL-L-9V; OC_FARNELL: unknown; OC_NEWARK: 12N3892; OC_NEWARK: 12N3895; OC_NEWARK: 12N3898; OC_NEWARK: 12N3902; OC_NEWARK: 12N3905; OC_NEWARK: unknown; OC_NEWARK: 12N3908; OC_NEWARK: 12N3911
footprint TXD2SL
part A pins: 1 -, 12 +
part B pins: 3 O, 4 P, 5 S
part C pins: 8 S, 9 P, 10 O

## TX?-*S2SS-
designator K?, comment TX Relais NAiS   TX-D RELAYS HIGH INSULATION Conforming to the supplementary insulation class of EN Standards (EN41003) Source: http://www.mew-europe.com/..  en_ds_61022_0007.pdf TX-S RELAYS SMALL POLARIZED RELAY WITH HIGH SENSITIVITY 50mW Source: http://www.mew-europe.com/..  en_ds_61022_0022.pdf  (value not drawn)
MPN: TXS2SS-1.5V; MPN: TXS2SS-12V; MPN: TXS2SS-24V-Z; MPN: TXS2SS-3V-Z; MPN: TXS2SS-4.5V; MPN: TXS2SS-6V; MPN: TXS2SS-9V; OC_FARNELL: unknown; OC_NEWARK: 11N6094; OC_NEWARK: 13P9561; OC_NEWARK: 13P9563; OC_NEWARK: 13P9564; OC_NEWARK: 13P9565; OC_NEWARK: unknown; OC_NEWARK: 11N6103; OC_NEWARK: 11N6106
footprint TXD2SS
part A pins: 1 +, 12 -
part B pins: 3 O, 4 P, 5 S
part C pins: 8 S, 9 P, 10 O

## TX?-*S2SS-L
designator K?, comment TX Relais NAiS   TX-D RELAYS HIGH INSULATION Conforming to the supplementary insulation class of EN Standards (EN41003) Source: http://www.mew-europe.com/..  en_ds_61022_0007.pdf TX-S RELAYS SMALL POLARIZED RELAY WITH HIGH SENSITIVITY 50mW Source: http://www.mew-europe.com/..  en_ds_61022_0022.pdf  (value not drawn)
MPN: TXS2SS-L-1.5V; MPN: TXS2SS-L-12V; MPN: TXS2SS-L-24V; MPN: TXS2SS-L-3V; MPN: TXS2SS-L-4.5V; MPN: TXS2SS-L-6V; MPN: TXS2SS-L-9V; OC_FARNELL: unknown; OC_NEWARK: 12N3933; OC_NEWARK: 12N3936; OC_NEWARK: 12N3939; OC_NEWARK: 12N3942; OC_NEWARK: 12N3945; OC_NEWARK: unknown; OC_NEWARK: 12N3948; OC_NEWARK: 12N3951
footprint TXD2SS
part A pins: 1 -, 12 +
part B pins: 3 O, 4 P, 5 S
part C pins: 8 S, 9 P, 10 O

## V23040-*-B201
designator RL?, comment SIEMENS   Monostabil A0001 = 5V; A0002 = 12V; A0003 = 15V; A0004 = 24V Bistabil C0051 = 5V; C0052 = 12V  (value not drawn)
MPN: V23040-A0002-B201; OC_FARNELL: unknown; OC_NEWARK: unknown; OC_FARNELL: 1174994; OC_NEWARK: 24M9075
footprint V23040201
part A pins: 1, 2, 3
part B pins: 4, 5, 6

## V23127A
designator K?, comment RELAY   horizontal, 1 x switch, 5 A/300 V DC, 250 V AC, Siemens  (value not drawn)
OC_FARNELL: unknown; OC_NEWARK: unknown
footprint V23127A
part A pins: 1, 2
part B pins: O, P, S

## V23127B
designator K?, comment RELAY   vertical, 1 x switch, 5 A/300 V DC, 250 V AC, Siemens  (value not drawn)
OC_FARNELL: unknown; OC_NEWARK: unknown
footprint V23127B
part A pins: 1, 2
part B pins: O, P, S

## V23148-*-CO
designator K?, comment Power PCB Relay U/UB close/open   tyco/electronics; 1 pole 7 A, mono or bistabile www.schrackrelays.com/pdf/UUB.pdf  (value not drawn)
MPN: V23148-A1107-A101; MPN: V23148-A1105-A101; MPN: V23148-B0005-A101; MPN: V23148-B0008-A101; OC_FARNELL: 1175043; OC_NEWARK: 23M2638; OC_NEWARK: 34M8971; OC_FARNELL: 1175042; OC_NEWARK: 48M9081; OC_NEWARK: 16R7906
footprint V23148-CO
part A pins: A1 1, A2 2
part B pins: 11 P, 12 O, 14 S

## V23148-*-NO
designator K?, comment Power PCB Relay U/UB normal open   tyco/electronics;  1 pole 7 A, mono or bistabile www.schrackrelays.com/pdf/UUB.pdf  (value not drawn)
MPN: V23148-A0007-A101; MPN: V23148-A1105-A101; OC_FARNELL: 1175042; OC_NEWARK: 48M9078; OC_NEWARK: 34M8971; OC_FARNELL: 1175043
footprint V23148-NO
part A pins: A1 1, A2 2
part B pins: 11 P, 14 S

## VS-MODUL
designator IC?, comment ELECTRONIC SWITCHING CIRCUIT NAiS   Following Relais can combine to VS-Device: DE, DF, DK, DS, DSP, DX, R, RA, RG, RK, RM, RX, S, SP, ST, SX, TF, TN, TK, TQ, TQ-SA, TX Source: http://www.mew-europe.com/.. 1060dlde0301.pdf en_ds_61702_0000.pdf
OC_FARNELL: unknown; OC_NEWARK: unknown
footprint VS05-NAIS
pins: 1 L1, 2 K, 3 +, 4 L2, 5 -

## ZD?1*3
designator K?, comment Power Relay SCHRACK   1 pole 30 A Source: http://www.schrack.com/.. 5848.pdf  (value not drawn)
OC_FARNELL: unknown; OC_NEWARK: unknown
footprint ZD1
part A pins: A1 1, A2 2
part B pins: 11 P, 12 O, 14 S

## ZD?1*5
designator K?, comment Power Relay SCHRACK   1 pole 30 A Source: http://www.schrack.com/.. 5848.pdf  (value not drawn)
OC_FARNELL: unknown; OC_NEWARK: unknown
footprint ZD1F
part A pins: A1 1, A2 2
part B pins: 11 P, 12 O, 14 S

## ZD?2*3
designator K?, comment Power Relay SCHRACK   1 pole 30 A Source: http://www.schrack.com/.. 5848.pdf  (value not drawn)
OC_FARNELL: unknown; OC_NEWARK: unknown
footprint ZD2
part A pins: A1 1, A2 2
part B pins: 11 P, 14 S

## ZD?2*5
designator K?, comment Power Relay SCHRACK   1 pole 30 A Source: http://www.schrack.com/.. 5848.pdf  (value not drawn)
OC_FARNELL: unknown; OC_NEWARK: unknown
footprint ZD2F
part A pins: A1 1, A2 2
part B pins: 11 P, 14 S

## ZF112
designator K?, comment RELAY   1 x switch  (value not drawn)
OC_FARNELL: unknown; OC_NEWARK: unknown
footprint ZF112
part A pins: 1, 2
part B pins: O, P, S

## ZNS1*
designator K?, comment Miniature Power PCB Relay SCHRACK   1pole 10 A Source: http://www.schrack.com/.. 5847.pdf  (value not drawn)
OC_FARNELL: unknown; OC_NEWARK: unknown
footprint ZN1
part A pins: A1 1, A2 2
part B pins: 11 P, 14 S

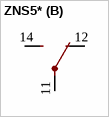
[diagram p30: symbol ZNS5*]

## ZNS5*
designator K?, comment Miniature Power PCB Relay SCHRACK   1pole 10 A Source: http://www.schrack.com/.. 5847.pdf  (value not drawn)
OC_FARNELL: unknown; OC_NEWARK: unknown
footprint ZN5
part A pins: A1 1, A2 2
part B pins: 11 P, 12 O, 14 S